# Altium footprint library Miscellaneous C_nn.PcbLib: 416 footprints (part 17 of 26)
Each footprint in its own frame and in the unit in brackets; x right, y up, seen from the top. Pads: shape width x height; smd on the part's side, far side on the other; paste and mask are expansions set on the pad; w line width, h text height; cw(c..) or ccw(c..) is an arc to the next point about the centre after c.
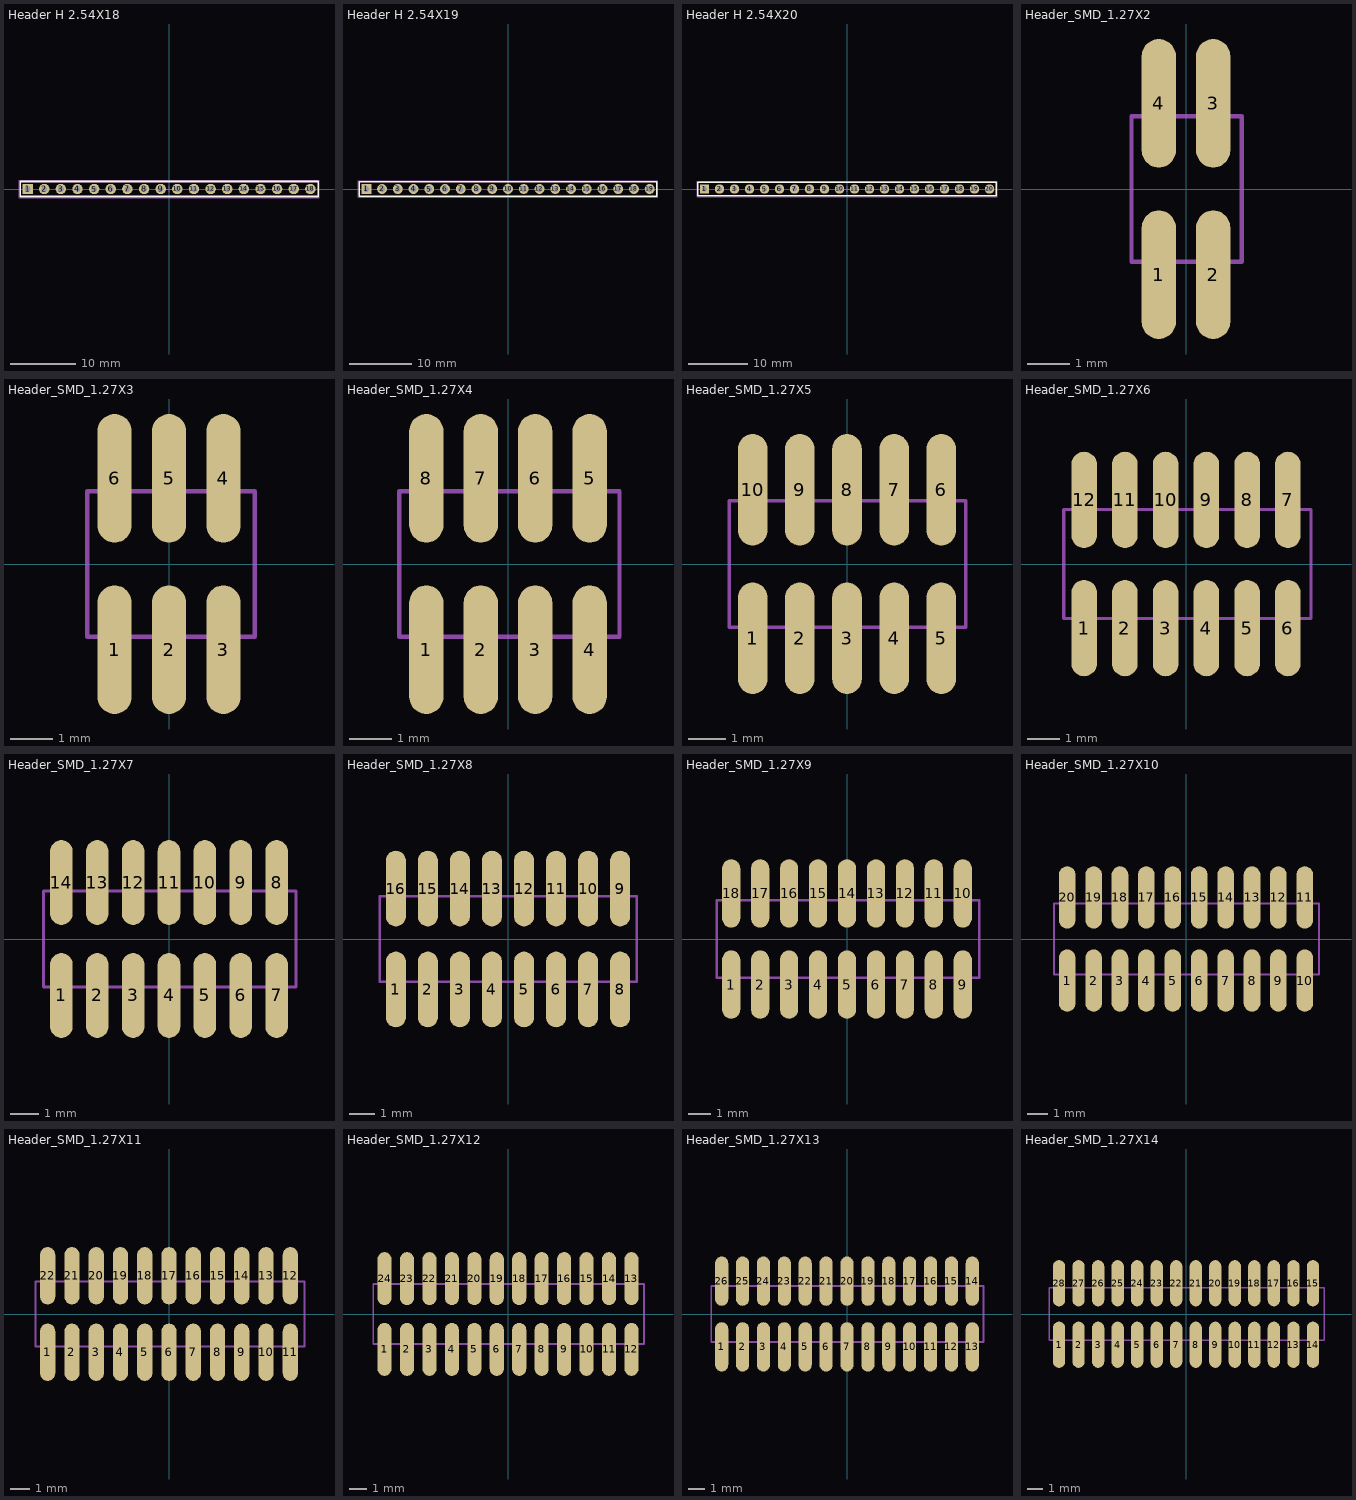
[diagram p16: the footprints below, top view; thin cyan lines are the x and y axes]

## Header H 2.54X18 [mm]
pads (18):
  rect 1.6x1.6 hole 0.9: 1(-21.59,0)
  round 1.6 hole 0.9: 2(-19.05,0) 3(-16.51,0) 4(-13.97,0) 5(-11.43,0) 6(-8.89,0) 7(-6.35,0) 8(-3.81,0) 9(-1.27,0) 10(1.27,0) 11(3.81,0) 12(6.35,0) 13(8.89,0) 14(11.43,0) 15(13.97,0) 16(16.51,0) 17(19.05,0) 18(21.59,0)
Top Overlay:
  lines w0.254: -22.733,-1.143 -22.733,1.143 22.8,1.143 22.8,-1.143 -22.733,-1.143
Mechanical 15:
  lines w0.1: -0.5,0 0.5,0 ; 0,-0.5 0,0.5 ; -22.9,-1.3 -22.9,1.3 22.9,1.3 22.9,-1.3 -22.9,-1.3
3D body "HEADER 18H.STEP": height 4.43, standoff -2.9, extent -22.863,-1.268 22.857,7.002

## Header H 2.54X19 [mm]
pads (19):
  rect 1.6x1.6 hole 0.9: 1(-22.86,0)
  round 1.6 hole 0.9: 2(-20.32,0) 3(-17.78,0) 4(-15.24,0) 5(-12.7,0) 6(-10.16,0) 7(-7.62,0) 8(-5.08,0) 9(-2.54,0) 10(0,0) 11(2.54,0) 12(5.08,0) 13(7.62,0) 14(10.16,0) 15(12.7,0) 16(15.24,0) 17(17.78,0) 18(20.32,0) 19(22.86,0)
Top Overlay:
  lines w0.254: -24.003,-1.143 -24.003,1.143 24,1.143 24,-1.143 -24.003,-1.143
Mechanical 15:
  lines w0.1: -24.2,-1.3 -24.2,1.3 24.2,1.3 24.2,-1.3 -24.2,-1.3
3D body "HEADER 19H.STEP": height 4.43, standoff -2.9, extent -24.123,-1.268 24.137,7.002

## Header H 2.54X20 [mm]
pads (20):
  rect 1.6x1.6 hole 0.9: 1(-24.13,0)
  round 1.6 hole 0.9: 2(-21.59,0) 3(-19.05,0) 4(-16.51,0) 5(-13.97,0) 6(-11.43,0) 7(-8.89,0) 8(-6.35,0) 9(-3.81,0) 10(-1.27,0) 11(1.27,0) 12(3.81,0) 13(6.35,0) 14(8.89,0) 15(11.43,0) 16(13.97,0) 17(16.51,0) 18(19.05,0) 19(21.59,0) 20(24.13,0)
Top Overlay:
  lines w0.254: -25.273,-1.143 25.3,-1.143 25.3,1.143 -25.273,1.143 -25.273,-1.143
Mechanical 15:
  lines w0.1: -0.5,0 0.5,0 ; 0,-0.5 0,0.5 ; -25.4,-1.3 25.4,-1.3 25.4,1.3 -25.4,1.3 -25.4,-1.3
3D body "HEADER 20H.STEP": height 4.43, standoff -2.9, extent -25.4,-1.27 25.4,7

## Header_SMD_1.27X2 [mm]
pads (4):
  oval 0.8x3 smd: 1(-0.635,-2) 2(0.635,-2) 3(0.635,2) 4(-0.635,2)
Mechanical 15:
  lines w0.1: -1.27,-1.7 1.3,-1.7 1.3,1.7 -1.27,1.7 -1.27,-1.7
3D body "HEADER SMD 1.27X4.stp": height 6.4, standoff 0, extent -1.24,-2.752 1.3,2.752

## Header_SMD_1.27X3 [mm]
pads (6):
  oval 0.8x3 smd: 1(-1.27,-2) 2(0,-2) 3(1.27,-2) 4(1.27,2) 5(0,2) 6(-1.27,2)
Mechanical 15:
  lines w0.1: -1.905,-1.7 -1.905,1.7 2,1.7 2,-1.7 -1.905,-1.7
3D body "HEADER SMD 1.27X6.stp": height 6.4, standoff 0, extent -1.875,-2.752 1.935,2.752

## Header_SMD_1.27X4 [mm]
pads (8):
  oval 0.8x3 smd: 1(-1.905,-2) 2(-0.635,-2) 3(0.635,-2) 4(1.905,-2) 5(1.905,2) 6(0.635,2) 7(-0.635,2) 8(-1.905,2)
Mechanical 15:
  lines w0.1: -2.54,-1.7 2.6,-1.7 2.6,1.7 -2.54,1.7 -2.54,-1.7
3D body "HEADER SMD 1.27X8.stp": height 6.4, standoff 0, extent -2.51,-2.752 2.57,2.752

## Header_SMD_1.27X5 [mm]
pads (10):
  oval 0.8x3 smd: 1(-2.54,-2) 2(-1.27,-2) 3(0,-2) 4(1.27,-2) 5(2.54,-2) 6(2.54,2) 7(1.27,2) 8(0,2) 9(-1.27,2) 10(-2.54,2)
Mechanical 15:
  lines w0.1: -3.175,-1.7 -3.175,1.7 3.2,1.7 3.2,-1.7 -3.175,-1.7
3D body "HEADER SMD 1.27X10.stp": height 6.4, standoff 0, extent -3.145,-2.752 3.205,2.752

## Header_SMD_1.27X6 [mm]
pads (12):
  oval 0.8x3 smd: 1(-3.175,-2) 2(-1.905,-2) 3(-0.635,-2) 4(0.635,-2) 5(1.905,-2) 6(3.175,-2) 7(3.175,2) 8(1.905,2) 9(0.635,2) 10(-0.635,2) 11(-1.905,2) 12(-3.175,2)
Mechanical 15:
  lines w0.1: -3.81,-1.7 3.9,-1.7 3.9,1.7 -3.81,1.7 -3.81,-1.7
3D body "HEADER SMD 1.27X12.stp": height 6.4, standoff 0, extent -3.78,-2.752 3.84,2.752

## Header_SMD_1.27X7 [mm]
pads (14):
  oval 0.8x3 smd: 1(-3.81,-2) 2(-2.54,-2) 3(-1.27,-2) 4(0,-2) 5(1.27,-2) 6(2.54,-2) 7(3.81,-2) 8(3.81,2) 9(2.54,2) 10(1.27,2) 11(0,2) 12(-1.27,2) 13(-2.54,2) 14(-3.81,2)
Mechanical 15:
  lines w0.1: -4.445,-1.7 -4.445,1.7 4.5,1.7 4.5,-1.7 -4.445,-1.7
3D body "HEADER SMD 1.27X14.stp": height 6.4, standoff 0, extent -4.415,-2.752 4.475,2.752

## Header_SMD_1.27X8 [mm]
pads (16):
  oval 0.8x3 smd: 1(-4.445,-2) 2(-3.175,-2) 3(-1.905,-2) 4(-0.635,-2) 5(0.635,-2) 6(1.905,-2) 7(3.175,-2) 8(4.445,-2) 9(4.445,2) 10(3.175,2) 11(1.905,2) 12(0.635,2) 13(-0.635,2) 14(-1.905,2) 15(-3.175,2) 16(-4.445,2)
Mechanical 15:
  lines w0.1: -5.08,-1.7 5.1,-1.7 5.1,1.7 -5.08,1.7 -5.08,-1.7
3D body "HEADER SMD 1.27X16.stp": height 6.4, standoff 0, extent -5.05,-2.752 5.11,2.752

## Header_SMD_1.27X9 [mm]
pads (18):
  oval 0.8x3 smd: 1(-5.08,-2) 2(-3.81,-2) 3(-2.54,-2) 4(-1.27,-2) 5(0,-2) 6(1.27,-2) 7(2.54,-2) 8(3.81,-2) 9(5.08,-2) 10(5.08,2) 11(3.81,2) 12(2.54,2) 13(1.27,2) 14(0,2) 15(-1.27,2) 16(-2.54,2) 17(-3.81,2) 18(-5.08,2)
Mechanical 15:
  lines w0.1: -5.715,-1.7 -5.715,1.7 5.8,1.7 5.8,-1.7 -5.715,-1.7
3D body "HEADER SMD 1.27X18.stp": height 6.4, standoff 0, extent -5.685,-2.752 5.745,2.752

## Header_SMD_1.27X10 [mm]
pads (20):
  oval 0.8x3 smd: 1(-5.715,-2) 2(-4.445,-2) 3(-3.175,-2) 4(-1.905,-2) 5(-0.635,-2) 6(0.635,-2) 7(1.905,-2) 8(3.175,-2) 9(4.445,-2) 10(5.715,-2) 11(5.715,2) 12(4.445,2) 13(3.175,2) 14(1.905,2) 15(0.635,2) 16(-0.635,2) 17(-1.905,2) 18(-3.175,2) 19(-4.445,2) 20(-5.715,2)
Mechanical 15:
  lines w0.1: -6.35,-1.7 6.4,-1.7 6.4,1.7 -6.35,1.7 -6.35,-1.7
3D body "HEADER SMD 1.27X20.stp": height 6.4, standoff 0, extent -6.32,-2.752 6.38,2.752

## Header_SMD_1.27X11 [mm]
pads (22):
  oval 0.8x3 smd: 1(-6.35,-2) 2(-5.08,-2) 3(-3.81,-2) 4(-2.54,-2) 5(-1.27,-2) 6(0,-2) 7(1.27,-2) 8(2.54,-2) 9(3.81,-2) 10(5.08,-2) 11(6.35,-2) 12(6.35,2) 13(5.08,2) 14(3.81,2) 15(2.54,2) 16(1.27,2) 17(0,2) 18(-1.27,2) 19(-2.54,2) 20(-3.81,2) 21(-5.08,2) 22(-6.35,2)
Mechanical 15:
  lines w0.1: -6.985,-1.7 -6.985,1.7 7.1,1.7 7.1,-1.7 -6.985,-1.7
3D body "HEADER SMD 1.27X22.stp": height 6.4, standoff 0, extent -6.955,-2.752 7.015,2.752

## Header_SMD_1.27X12 [mm]
pads (24):
  oval 0.8x3 smd: 1(-6.985,-2) 2(-5.715,-2) 3(-4.445,-2) 4(-3.175,-2) 5(-1.905,-2) 6(-0.635,-2) 7(0.635,-2) 8(1.905,-2) 9(3.175,-2) 10(4.445,-2) 11(5.715,-2) 12(6.985,-2) 13(6.985,2) 14(5.715,2) 15(4.445,2) 16(3.175,2) 17(1.905,2) 18(0.635,2) 19(-0.635,2) 20(-1.905,2) 21(-3.175,2) 22(-4.445,2) 23(-5.715,2) 24(-6.985,2)
Mechanical 15:
  lines w0.1: -7.62,-1.7 -7.62,1.7 7.7,1.7 7.7,-1.7 -7.62,-1.7
3D body "HEADER SMD 1.27X24.stp": height 6.4, standoff 0, extent -7.59,-2.752 7.65,2.752

## Header_SMD_1.27X13 [mm]
pads (26):
  oval 0.8x3 smd: 1(-7.62,-2) 2(-6.35,-2) 3(-5.08,-2) 4(-3.81,-2) 5(-2.54,-2) 6(-1.27,-2) 7(0,-2) 8(1.27,-2) 9(2.54,-2) 10(3.81,-2) 11(5.08,-2) 12(6.35,-2) 13(7.62,-2) 14(7.62,2) 15(6.35,2) 16(5.08,2) 17(3.81,2) 18(2.54,2) 19(1.27,2) 20(0,2) 21(-1.27,2) 22(-2.54,2) 23(-3.81,2) 24(-5.08,2) 25(-6.35,2) 26(-7.62,2)
Mechanical 15:
  lines w0.1: -8.255,-1.7 8.3,-1.7 8.3,1.7 -8.255,1.7 -8.255,-1.7
3D body "HEADER SMD 1.27X26.stp": height 6.4, standoff 0, extent -8.225,-2.752 8.285,2.752

## Header_SMD_1.27X14 [mm]
pads (28):
  oval 0.8x3 smd: 1(-8.255,-2) 2(-6.985,-2) 3(-5.715,-2) 4(-4.445,-2) 5(-3.175,-2) 6(-1.905,-2) 7(-0.635,-2) 8(0.635,-2) 9(1.905,-2) 10(3.175,-2) 11(4.445,-2) 12(5.715,-2) 13(6.985,-2) 14(8.255,-2) 15(8.255,2) 16(6.985,2) 17(5.715,2) 18(4.445,2) 19(3.175,2) 20(1.905,2) 21(0.635,2) 22(-0.635,2) 23(-1.905,2) 24(-3.175,2) 25(-4.445,2) 26(-5.715,2) 27(-6.985,2) 28(-8.255,2)
Mechanical 15:
  lines w0.1: -8.89,-1.7 9,-1.7 9,1.7 -8.89,1.7 -8.89,-1.7
3D body "HEADER SMD 1.27X28.stp": height 6.4, standoff 0, extent -8.86,-2.752 8.92,2.752